# Altium footprint library CustomCase.PcbLib: 274 footprints (part 11 of 18)
Each footprint in its own frame and in the unit in brackets; x right, y up, seen from the top. Pads: shape width x height; smd on the part's side, far side on the other; paste and mask are expansions set on the pad; w line width, h text height; cw(c..) or ccw(c..) is an arc to the next point about the centre after c.
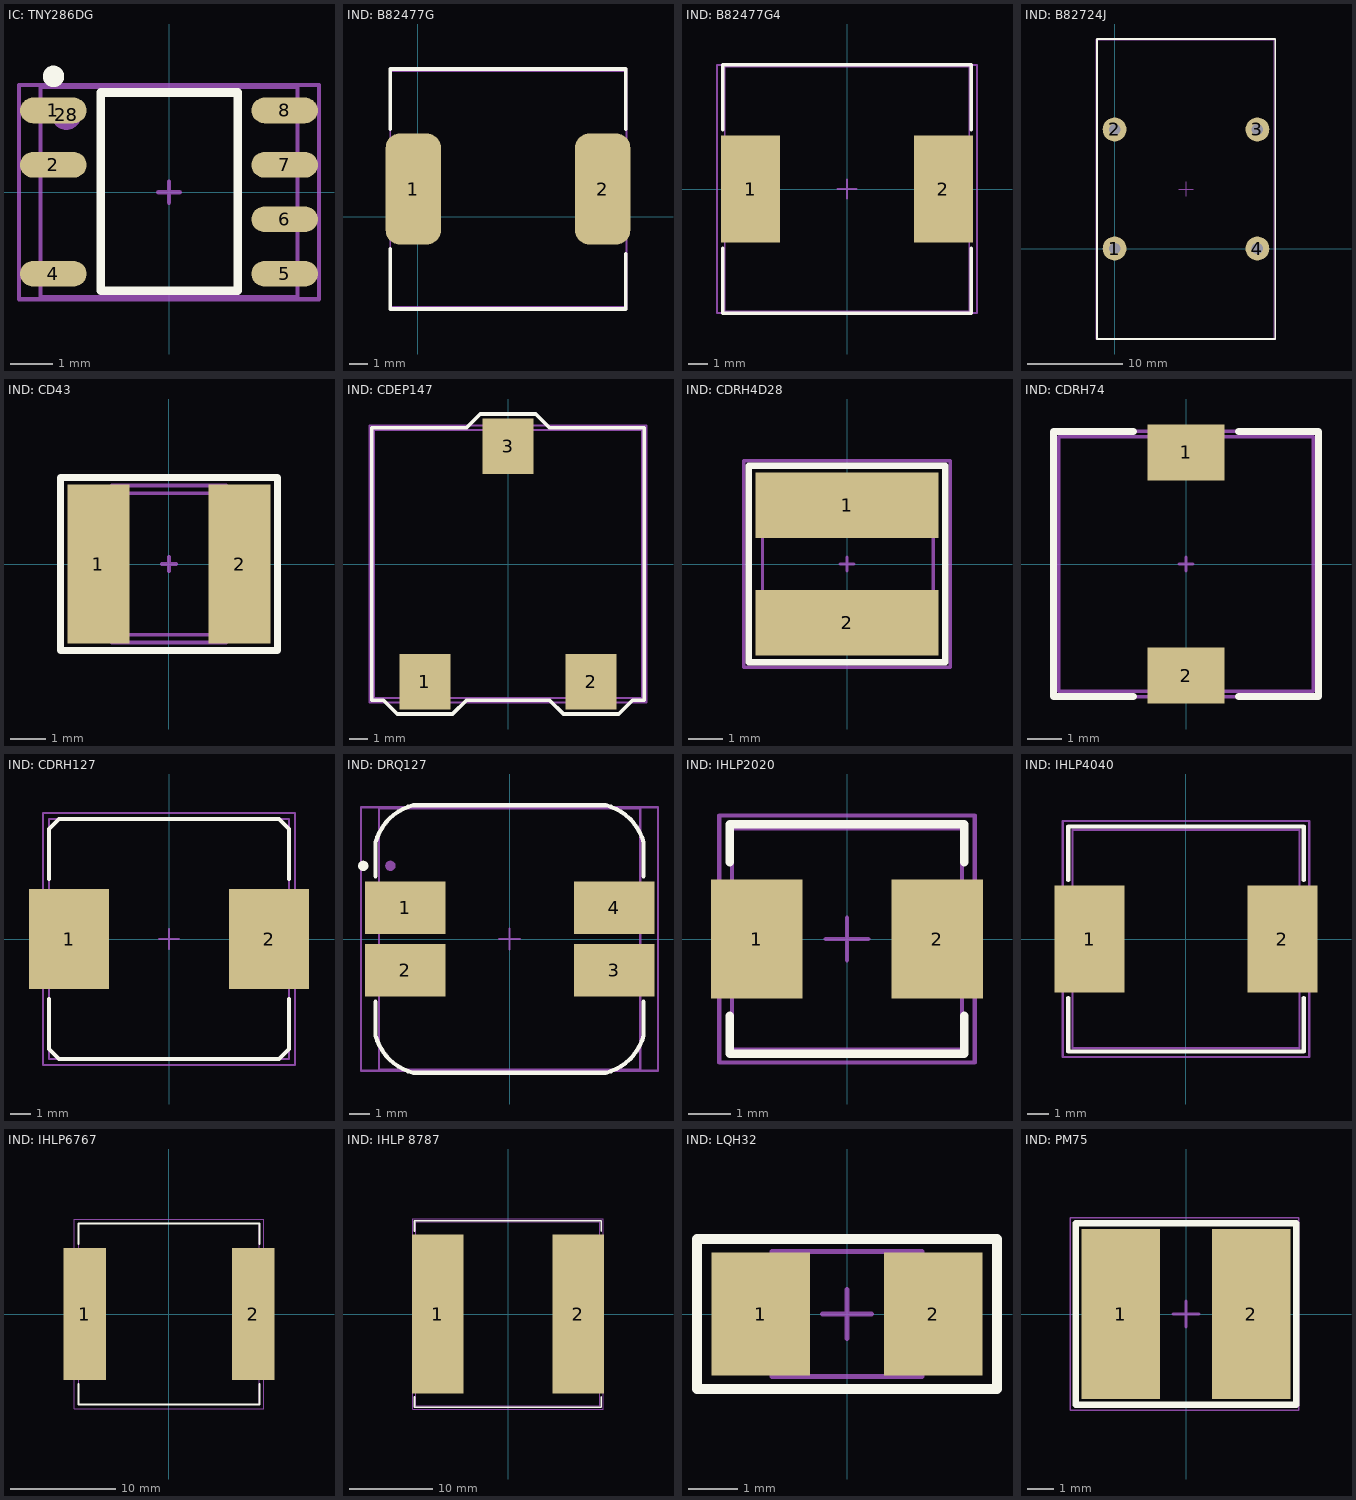
[diagram p10: the footprints below, top view; thin cyan lines are the x and y axes]

## IC: TNY286DG [mm]
pads (8):
  rrect100% 1.55x0.6 smd: 1(-2.7,1.905) 2(-2.7,0.635) 4(-2.7,-1.905) 5(2.7,-1.905) 6(2.7,-0.635) 7(2.7,0.635) 8(2.7,1.905)
  round 0.7 on Mech1: 28(-2.395,1.8)
Top Overlay:
  circle w0.25: c-2.695,2.7 r0.125
  lines w0.2: -1.595,-2.3 -1.595,2.325 1.605,2.325 1.605,-2.3 -1.595,-2.3
Top Assy:
  lines w0.1: -3,-2.45 3,-2.45 3,2.45 -3,2.45 -3,-2.45
Size Area:
  lines w0.1: -0.25,0 0.25,0 ; 0,-0.25 0,0.25 ; -3.5,-2.5 3.5,-2.5 3.5,2.5 -3.5,2.5 -3.5,-2.5
3D body "User Library-SOIC-7.STEP": height 1.75, standoff 0, extent -3,-2.45 3,2.45

## IND: B82477G [mm]
pads (2):
  rrect50% 3x6 smd: 1(-0.25,1.5) 2(10,1.5)
Top Overlay:
  lines w0.2: -1.5,-1.75 -1.5,-5 11.25,-5 11.25,-2 ; -1.5,4.75 -1.5,8 11.25,8 11.25,4.75
Top Assy:
  lines w0.1: -1.5,-4.9 -1.5,7.9 11.3,7.9 11.3,-4.9 -1.5,-4.9
Size Area:
  lines w0.1: -1.5,-5 -1.5,8 11.2,8 11.3,8 11.3,4 11.3,-5 -1.5,-5
3D body "User Library-b82477g4.STEP": height 8, standoff 0, extent -1.5,-4.9 11.3,7.9

## IND: B82477G4 [mm]
pads (2):
  rect 3.1x5.6 smd: 1(-5.05,0) 2(5.05,0)
Top Overlay:
  lines w0.2: -6.5,-3.1 -6.5,-6.5 6.5,-6.5 6.5,-3.1 ; -6.5,3.1 -6.5,6.5 6.5,6.5 6.5,3.1
Top Assy:
  lines w0.1: 6.4,-6.4 6.4,6.4 ; 6.4,-6.4 6.4,-6.4 ; 6.4,-6.4 -6.4,-6.4 -6.4,6.4 6.4,6.4 ; 6.4,6.4 6.4,6.4
Size Area:
  lines w0.1: -0.5,0 0.5,0 ; 0,-0.5 0,0.5 ; -6.8,-6.5 -6.8,6.5 6.8,6.5 6.8,-6.5 -6.8,-6.5
3D body "User Library-b82477g4.STEP": height 8, standoff 0, extent -6.4,-6.4 6.4,6.4

## IND: B82724J [mm]
pads (4):
  round 2.5 hole 1.2: 1(0,0) 2(0,12.5) 3(15,12.5) 4(15,0)
Top Overlay:
  lines w0.2: -1.85,-9.5 16.875,-9.5 16.875,22 -1.85,22 -1.85,-9.5
Top Assy:
  lines w0.1: -1.75,-9.4 16.75,-9.4 16.75,21.9 -1.75,21.9 -1.75,-9.4
Size Area:
  lines w0.1: 6.75,6.25 8.25,6.25 ; 7.5,5.5 7.5,7 ; -1.9,-9.5 16.9,-9.5 16.9,22 -1.9,22 -1.9,-9.5
3D body "User Library-B82724J.STEP": height 33.21, standoff -4, extent -1.75,-9.4 16.75,21.9

## IND: CD43 [mm]
height 3.2
pads (2):
  rect 1.75x4.5 smd: 1(-2,0) 2(2,0)
Top Overlay:
  lines w0.2: -3.075,-2.45 -3.075,2.45 3.075,2.45 3.075,-2.45 -3.075,-2.45
Top Assy:
  lines w0.1: -1.5,-2 cw(c0,0) -1.5,2 1.5,2 cw(c0,0) 1.5,-2 -1.5,-2
Size Area:
  lines w0.1: -0.2,0 0.2,0 ; 0,-0.2 0,0.2 ; -1.617,-2.224 cw(c0,0) -1.617,2.224 1.617,2.224 cw(c0,0) 1.617,-2.224 -1.617,-2.224
3D body "CD43.STEP": height 3.2, standoff 0, extent -2.244,-2 2.244,2

## IND: CDEP147 [mm]
height 8
pads (3):
  rect 2.75x3 smd: 1(-4.5,-6.375) 2(4.5,-6.375) 3(0,6.375)
Top Overlay:
  lines w0.2: -7.375,-7.375 -6.75,-7.375 -6,-8.125 -3,-8.125 -2.25,-7.375 2.25,-7.375 3,-8.125 6,-8.125 6.75,-7.375 7.375,-7.375 7.375,7.375 2.25,7.375 1.5,8.125 -1.5,8.125 -2.25,7.375 -7.375,7.375 -7.375,-7.375
Top Assy:
  lines w0.1: -7.25,-7.25 -7.25,7.25 7.25,7.25 7.25,-7.25 -7.25,-7.25
Size Area:
  lines w0.1: -7.5,-7.5 -7.5,7.5 7.5,7.5 7.5,-7.5 -7.5,-7.5
3D body "CDEP147.STEP": height 8.05, standoff 0.05, extent -7.25,-7.25 7.25,7.25

## IND: CDRH4D28 [mm]
pads (2):
  rect 5.3x1.9 smd: 1(0,1.7) 2(0,-1.7)
Top Overlay:
  lines w0.2: -2.85,-2.85 2.85,-2.85 2.85,2.85 -2.85,2.85 -2.85,-2.85
Top Assy:
  lines w0.1: -2.45,-2.5 -2.45,2.5 2.5,2.5 2.5,-2.5 -2.45,-2.5
Size Area:
  lines w0.1: -0.2,0 0.2,0 ; 0,-0.2 0,0.2 ; -3,-3 -3,3 3,3 3,-3 -3,-3
3D body "User Library-CDRH4D28.STEP": height 2.91, standoff 0, extent -2.45,-2.45 2.45,2.45

## IND: CDRH74 [mm]
height 4.5
pads (2):
  rect 2.2x1.6 smd: 1(0,3.2) 2(0,-3.2)
Top Overlay:
  lines w0.2: -1.5,-3.8 -3.8,-3.8 -3.8,3.8 -1.5,3.8 ; 1.5,-3.8 3.8,-3.8 3.8,3.8 1.5,3.8
Top Assy:
  lines w0.1: -3.65,-3.65 3.65,-3.65 3.65,3.65 -3.65,3.65 -3.65,-3.65
Size Area:
  lines w0.1: -0.2,0 0.2,0 ; 0,-0.2 0,0.2 ; -3.8,-3.8 3.8,-3.8 3.8,3.8 -3.8,3.8 -3.8,-3.8
3D body "User Library-CDRH74NP-220MC.step": height 4.5, standoff 0, extent -3.65,-3.65 3.65,3.65

## IND: CDRH127 [mm]
height 8.5
pads (2):
  rect 4x5 smd: 1(-5,0) 2(5,0)
Top Overlay:
  lines w0.2: -6,-3 -6,-5.5 -5.5,-6 5.5,-6 6,-5.5 6,-3 ; -6,3 -6,5.5 -5.5,6 5.5,6 6,5.5 6,3
Top Assy:
  lines w0.1: -6,-6 6,-6 6,6 -6,6 -6,-6
Size Area:
  lines w0.1: -0.5,0 0.5,0 ; 0,-0.5 0,0.5 ; -6.3,-6.3 -6.3,6.3 6.3,6.3 6.3,-6.3 -6.3,-6.3
3D body "CDRH127-2.step": height 8.05, standoff 0.05, extent -6,-6 6,6

## IND: DRQ127 [mm] "Inductor"
height 5.1
pads (6):
  rect 3.85x2.5 smd: 1(-5,1.5) 2(-5,-1.5) 3(5,-1.5) 4(5,1.5)
  round 0.5 on Top Overlay: ""(-7,3.5)
  round 0.5 on Mech1: ""(-5.7,3.5)
Top Overlay:
  lines w0.2: -6.408,-3 -6.408,-4.625 ccw(c-3.994,-3.975) -4.6,-6.4 ; -6.408,3 -6.408,4.625 cw(c-3.994,3.975) -4.6,6.4 ; -4.606,-6.4 4.6,-6.4 ccw(c3.994,-3.975) 6.408,-4.625 6.408,-3 ; -4.606,6.4 4.6,6.4 cw(c3.994,3.975) 6.408,4.625 6.408,3
Top Assy:
  lines w0.1: -6.25,-6.25 6.25,-6.25 6.25,6.25 -6.25,6.25 -6.25,-6.25
Size Area:
  lines w0.1: -0.5,0 0.5,0 ; 0,-0.5 0,0.5 ; -7.1,-6.3 -7.1,6.3 7.1,6.3 7.1,-6.3 -7.1,-6.3
3D body "SW3dPS-DRQ127_12.5x12.5.STEP": height 8, standoff 0, extent -6.25,-6.25 6.25,6.25

## IND: IHLP2020 [mm] "SMD inductor, 5.2x5.2x3 mm"
height 3
pads (2):
  rect 2.15x2.8 smd: 1(-2.125,0) 2(2.125,0)
Top Overlay:
  lines w0.2: -2.75,-1.8 -2.75,-2.7 2.75,-2.7 2.75,-1.8 ; -2.75,1.8 -2.75,2.7 2.75,2.7 2.75,1.8
Top Assy:
  lines w0.1: -2.7,-2.6 -2.7,2.6 2.7,2.6 2.7,-2.6 -2.7,-2.6
Size Area:
  lines w0.1: -0.5,0 0.5,0 ; 0,-0.5 0,0.5 ; -3,-2.9 -3,2.9 3,2.9 3,-2.9 -3,-2.9
3D body "IHLP-2020.stp": height 2.89, standoff 0.03, extent -2.725,-2.571 2.725,2.575

## IND: IHLP4040 [mm] "SMD inductor, 10.3x10.8x4 mm"
height 4
pads (2):
  rect 3.25x5 smd: 1(-4.5,0) 2(4.5,0)
Top Overlay:
  lines w0.2: -5.5,-2.75 -5.5,-5.25 5.5,-5.25 5.5,-2.75 ; -5.5,2.75 -5.5,5.25 5.5,5.25 5.5,2.75
Top Assy:
  lines w0.1: -5.3,-5.1 5.3,-5.1 5.3,5.1 -5.3,5.1 -5.3,-5.1
Size Area:
  lines w0.1: -5.75,-5.5 5.75,-5.5 5.75,5.5 -5.75,5.5 -5.75,-5.5
3D body "IHLP-4040.stp": height 3.94, standoff 0.06, extent -5.311,-5.1 5.311,5.116

## IND: IHLP6767 [mm] "SMT inductor, 17x17x7 mm"
height 7
pads (2):
  rect 4x12.5 smd: 1(-8,0) 2(8,0)
Top Overlay:
  lines w0.2: -8.6,-6.65 -8.6,-8.6 8.6,-8.6 8.6,-6.65 ; -8.6,6.65 -8.6,8.6 8.6,8.6 8.6,6.65
Top Assy:
  lines w0.1: -8.588,-8.576 8.588,-8.576 8.588,8.6 -8.588,8.6 -8.588,-8.576
Size Area:
  lines w0.1: -9,-9 -9,9 9,9 9,-9 -9,-9
3D body "IHLP6767.stp": height 6.99, standoff 0.1, extent -8.588,-8.576 8.588,8.6

## IND: IHLP 8787 [mm] "SMT inductor, 22.5x22x13 mm"
height 13
pads (2):
  rect 6.25x19.25 smd: 1(-8.5,0) 2(8.5,0)
Top Overlay:
  lines w0.2: -11.3,-10 -11.3,-11.25 11.25,-11.25 11.25,-10 ; -11.3,10 -11.3,11.25 11.25,11.25 11.25,10
Top Assy:
  lines w0.1: -11.158,-11.112 11.097,-11.112 11.097,11.143 -11.158,11.143 -11.158,-11.112
Size Area:
  lines w0.1: -11.5,-11.5 11.5,-11.5 11.5,11.5 -11.5,11.5 -11.5,-11.5
3D body "IHLP8787MZ.STEP": height 12.9, standoff 0.02, extent -11.158,-11.112 11.097,11.143

## IND: LQH32 [mm]
height 4
pads (2):
  rect 2x2.5 smd: 1(-1.75,0) 2(1.75,0)
Top Overlay:
  lines w0.2: -3.048,-1.524 -3.048,1.524 3.048,1.524 3.048,-1.524 -3.048,-1.524
Top Assy:
  lines w0.1: -1.524,-1.27 1.524,-1.27 1.524,1.27 -1.524,1.27 -1.524,-1.27
Size Area:
  lines w0.1: -0.5,0 0.5,0 ; 0,-0.5 0,0.5 ; -3.048,-1.524 -3.048,1.524 3.048,1.524 3.048,-1.524 -3.048,-1.524
3D body "дроссель_смд_25_3.STEP": height 2.5, standoff 0, extent -1.5,-1.25 1.5,1.25

## IND: PM75 [mm]
height 15
pads (2):
  rect 3x6.5 smd: 1(-2.5,0) 2(2.5,0)
Top Overlay:
  lines w0.254: -4.225,-3.475 4.225,-3.475 4.225,3.475 -4.225,3.475 -4.225,-3.475
Top Assy:
  lines w0.1: -4.225,-3.475 4.225,-3.475 4.225,3.475 -4.225,3.475 -4.225,-3.475
Size Area:
  lines w0.05: -4.445,-3.683 -4.445,3.683 4.318,3.683 4.318,-3.683 -4.445,-3.683
  lines w0.1: -0.5,0 0.5,0 ; 0,-0.5 0,0.5
3D body "PM75 series bourns inductor.STEP": height 5, standoff 0, extent -3.868,-3.5 3.868,3.5